# Altium schematic symbol library Regulator_Switching.SchLib: 1070 symbols (part 7 of 9) (continued)
## TNY286D (continued)
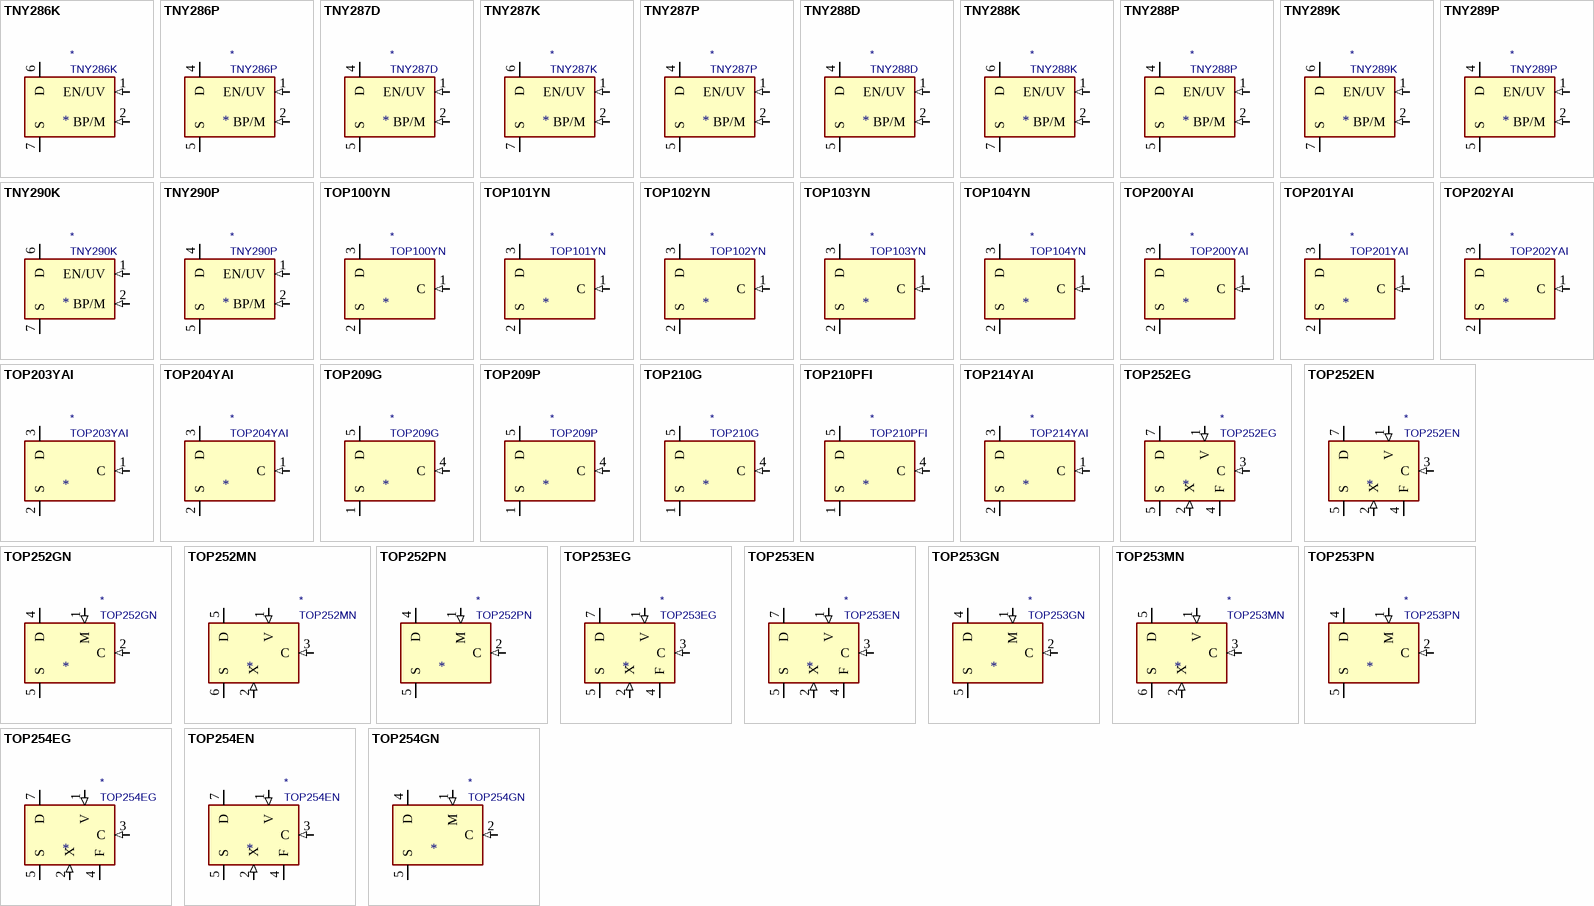
[diagram p21: symbols TNY286K to TOP254GN]

## TNY286K
designator *  value TNY286K
ki_keywords: Energy-Efficient, Off-Line Switcher With Line Compensated Overload Power; ki_description: TinySwitch-4 Family, 15W Output Power, eSOP-12B; ki_fp_filters: PowerIntegrations?eSOP?12B*; Footprint: Package_SO:PowerIntegrations_eSOP-12B; Supplier: https://ac-dc.power.com/sites/default/files/product-docs/tinyswitch-4_family_datasheet.pdf
footprint PowerIntegrations_eSOP-12B
pins: 1 EN/UV (in), 2 BP/M (in), 3 NC (in) hidden, 4 NC (in) hidden, 6 D (oc), 7 S (power), 8 S hidden, 9 S hidden, 10 S hidden, 11 S hidden, 12 S hidden, 13 S hidden

## TNY286P
designator *  value TNY286P
ki_keywords: Energy-Efficient, Off-Line Switcher With Line Compensated Overload Power; ki_description: TinySwitch-4 Family, 15W Output Power, PDIP-8C; ki_fp_filters: PowerIntegrations?PDIP?8C*; Footprint: Package_DIP:PowerIntegrations_PDIP-8C; Supplier: https://ac-dc.power.com/sites/default/files/product-docs/tinyswitch-4_family_datasheet.pdf
footprint PowerIntegrations_PDIP-8C
pins: 1 EN/UV (in), 2 BP/M (in), 4 D (oc), 5 S (power), 6 S hidden, 7 S hidden, 8 S hidden

## TNY287D
designator *  value TNY287D
ki_keywords: Energy-Efficient, Off-Line Switcher With Line Compensated Overload Power; ki_description: TinySwitch-4 Family, 18W Output Power, SO-8C; ki_fp_filters: PowerIntegrations?SO?8C*; Footprint: Package_SO:PowerIntegrations_SO-8C; Supplier: https://ac-dc.power.com/sites/default/files/product-docs/tinyswitch-4_family_datasheet.pdf
footprint PowerIntegrations_SO-8C
pins: 1 EN/UV (in), 2 BP/M (in), 4 D (oc), 5 S (power), 6 S hidden, 7 S hidden, 8 S hidden

## TNY287K
designator *  value TNY287K
ki_keywords: Energy-Efficient, Off-Line Switcher With Line Compensated Overload Power; ki_description: TinySwitch-4 Family, 18W Output Power, eSOP-12B; ki_fp_filters: PowerIntegrations?eSOP?12B*; Footprint: Package_SO:PowerIntegrations_eSOP-12B; Supplier: https://ac-dc.power.com/sites/default/files/product-docs/tinyswitch-4_family_datasheet.pdf
footprint PowerIntegrations_eSOP-12B
pins: 1 EN/UV (in), 2 BP/M (in), 3 NC (in) hidden, 4 NC (in) hidden, 6 D (oc), 7 S (power), 8 S hidden, 9 S hidden, 10 S hidden, 11 S hidden, 12 S hidden, 13 S hidden

## TNY287P
designator *  value TNY287P
ki_keywords: Energy-Efficient, Off-Line Switcher With Line Compensated Overload Power; ki_description: TinySwitch-4 Family, 18W Output Power, PDIP-8C; ki_fp_filters: PowerIntegrations?PDIP?8C*; Footprint: Package_DIP:PowerIntegrations_PDIP-8C; Supplier: https://ac-dc.power.com/sites/default/files/product-docs/tinyswitch-4_family_datasheet.pdf
footprint PowerIntegrations_PDIP-8C
pins: 1 EN/UV (in), 2 BP/M (in), 4 D (oc), 5 S (power), 6 S hidden, 7 S hidden, 8 S hidden

## TNY288D
designator *  value TNY288D
ki_keywords: Energy-Efficient, Off-Line Switcher With Line Compensated Overload Power; ki_description: TinySwitch-4 Family, 19.5W Output Power, SO-8C; ki_fp_filters: PowerIntegrations?SO?8C*; Footprint: Package_SO:PowerIntegrations_SO-8C; Supplier: https://ac-dc.power.com/sites/default/files/product-docs/tinyswitch-4_family_datasheet.pdf
footprint PowerIntegrations_SO-8C
pins: 1 EN/UV (in), 2 BP/M (in), 4 D (oc), 5 S (power), 6 S hidden, 7 S hidden, 8 S hidden

## TNY288K
designator *  value TNY288K
ki_keywords: Energy-Efficient, Off-Line Switcher With Line Compensated Overload Power; ki_description: TinySwitch-4 Family, 21.5W Output Power, eSOP-12B; ki_fp_filters: PowerIntegrations?eSOP?12B*; Footprint: Package_SO:PowerIntegrations_eSOP-12B; Supplier: https://ac-dc.power.com/sites/default/files/product-docs/tinyswitch-4_family_datasheet.pdf
footprint PowerIntegrations_eSOP-12B
pins: 1 EN/UV (in), 2 BP/M (in), 3 NC (in) hidden, 4 NC (in) hidden, 6 D (oc), 7 S (power), 8 S hidden, 9 S hidden, 10 S hidden, 11 S hidden, 12 S hidden, 13 S hidden

## TNY288P
designator *  value TNY288P
ki_keywords: Energy-Efficient, Off-Line Switcher With Line Compensated Overload Power; ki_description: TinySwitch-4 Family, 21.5W Output Power, PDIP-8C; ki_fp_filters: PowerIntegrations?PDIP?8C*; Footprint: Package_DIP:PowerIntegrations_PDIP-8C; Supplier: https://ac-dc.power.com/sites/default/files/product-docs/tinyswitch-4_family_datasheet.pdf
footprint PowerIntegrations_PDIP-8C
pins: 1 EN/UV (in), 2 BP/M (in), 4 D (oc), 5 S (power), 6 S hidden, 7 S hidden, 8 S hidden

## TNY289K
designator *  value TNY289K
ki_keywords: Energy-Efficient, Off-Line Switcher With Line Compensated Overload Power; ki_description: TinySwitch-4 Family, 25W Output Power, eSOP-12B; ki_fp_filters: PowerIntegrations?eSOP?12B*; Footprint: Package_SO:PowerIntegrations_eSOP-12B; Supplier: https://ac-dc.power.com/sites/default/files/product-docs/tinyswitch-4_family_datasheet.pdf
footprint PowerIntegrations_eSOP-12B
pins: 1 EN/UV (in), 2 BP/M (in), 3 NC (in) hidden, 4 NC (in) hidden, 6 D (oc), 7 S (power), 8 S hidden, 9 S hidden, 10 S hidden, 11 S hidden, 12 S hidden, 13 S hidden

## TNY289P
designator *  value TNY289P
ki_keywords: Energy-Efficient, Off-Line Switcher With Line Compensated Overload Power; ki_description: TinySwitch-4 Family, 25W Output Power, PDIP-8C; ki_fp_filters: PowerIntegrations?PDIP?8C*; Footprint: Package_DIP:PowerIntegrations_PDIP-8C; Supplier: https://ac-dc.power.com/sites/default/files/product-docs/tinyswitch-4_family_datasheet.pdf
footprint PowerIntegrations_PDIP-8C
pins: 1 EN/UV (in), 2 BP/M (in), 4 D (oc), 5 S (power), 6 S hidden, 7 S hidden, 8 S hidden

## TNY290K
designator *  value TNY290K
ki_keywords: Energy-Efficient, Off-Line Switcher With Line Compensated Overload Power; ki_description: TinySwitch-4 Family, 28.5W Output Power, eSOP-12B; ki_fp_filters: PowerIntegrations?eSOP?12B*; Footprint: Package_SO:PowerIntegrations_eSOP-12B; Supplier: https://ac-dc.power.com/sites/default/files/product-docs/tinyswitch-4_family_datasheet.pdf
footprint PowerIntegrations_eSOP-12B
pins: 1 EN/UV (in), 2 BP/M (in), 3 NC (in) hidden, 4 NC (in) hidden, 6 D (oc), 7 S (power), 8 S hidden, 9 S hidden, 10 S hidden, 11 S hidden, 12 S hidden, 13 S hidden

## TNY290P
designator *  value TNY290P
ki_keywords: Energy-Efficient, Off-Line Switcher With Line Compensated Overload Power; ki_description: TinySwitch-4 Family, 28.5W Output Power, PDIP-8C; ki_fp_filters: PowerIntegrations?PDIP?8C*; Footprint: Package_DIP:PowerIntegrations_PDIP-8C; Supplier: https://ac-dc.power.com/sites/default/files/product-docs/tinyswitch-4_family_datasheet.pdf
footprint PowerIntegrations_PDIP-8C
pins: 1 EN/UV (in), 2 BP/M (in), 4 D (oc), 5 S (power), 6 S hidden, 7 S hidden, 8 S hidden

## TOP100YN
designator *  value TOP100YN
ki_keywords: Three-terminal Off-line PWM Switch; ki_description: TOPSwitch Family, 20W Max Output Power, TO-220; ki_fp_filters: TO?220*; Footprint: Package_TO_SOT_THT:TO-220-3_Vertical; Supplier: http://www.powerint.com/sites/default/files/product-docs/top100.pdf
footprint TO-220-3_Vertical
pins: 1 C (in), 2 S (power), 3 D (oc)

## TOP101YN
designator *  value TOP101YN
ki_keywords: Three-terminal Off-line PWM Switch; ki_description: TOPSwitch Family, 35W Max Output Power, TO-220; ki_fp_filters: TO?220*; Footprint: Package_TO_SOT_THT:TO-220-3_Vertical; Supplier: http://www.powerint.com/sites/default/files/product-docs/top100.pdf
footprint TO-220-3_Vertical
pins: 1 C (in), 2 S (power), 3 D (oc)

## TOP102YN
designator *  value TOP102YN
ki_keywords: Three-terminal Off-line PWM Switch; ki_description: TOPSwitch Family, 45W Max Output Power, TO-220; ki_fp_filters: TO?220*; Footprint: Package_TO_SOT_THT:TO-220-3_Vertical; Supplier: http://www.powerint.com/sites/default/files/product-docs/top100.pdf
footprint TO-220-3_Vertical
pins: 1 C (in), 2 S (power), 3 D (oc)

## TOP103YN
designator *  value TOP103YN
ki_keywords: Three-terminal Off-line PWM Switch; ki_description: TOPSwitch Family, 55W Max Output Power, TO-220; ki_fp_filters: TO?220*; Footprint: Package_TO_SOT_THT:TO-220-3_Vertical; Supplier: http://www.powerint.com/sites/default/files/product-docs/top100.pdf
footprint TO-220-3_Vertical
pins: 1 C (in), 2 S (power), 3 D (oc)

## TOP104YN
designator *  value TOP104YN
ki_keywords: Three-terminal Off-line PWM Switch; ki_description: TOPSwitch Family, 60W Max Output Power, TO-220; ki_fp_filters: TO?220*; Footprint: Package_TO_SOT_THT:TO-220-3_Vertical; Supplier: http://www.powerint.com/sites/default/files/product-docs/top100.pdf
footprint TO-220-3_Vertical
pins: 1 C (in), 2 S (power), 3 D (oc)

## TOP200YAI
designator *  value TOP200YAI
ki_keywords: Three-terminal Off-line PWM Switch; ki_description: TOPSwitch Family, 12W Max Output Power, TO-220; ki_fp_filters: TO?220*; Footprint: Package_TO_SOT_THT:TO-220-3_Vertical; Supplier: http://www.powerint.com/sites/default/files/product-docs/top200-204214.pdf
footprint TO-220-3_Vertical
pins: 1 C (in), 2 S (power), 3 D (oc)

## TOP201YAI
designator *  value TOP201YAI
ki_keywords: Three-terminal Off-line PWM Switch; ki_description: TOPSwitch Family, 22W Max Output Power, TO-220; ki_fp_filters: TO?220*; Footprint: Package_TO_SOT_THT:TO-220-3_Vertical; Supplier: http://www.powerint.com/sites/default/files/product-docs/top200-204214.pdf
footprint TO-220-3_Vertical
pins: 1 C (in), 2 S (power), 3 D (oc)

## TOP202YAI
designator *  value TOP202YAI
ki_keywords: Three-terminal Off-line PWM Switch; ki_description: TOPSwitch Family, 30W Max Output Power, TO-220; ki_fp_filters: TO?220*; Footprint: Package_TO_SOT_THT:TO-220-3_Vertical; Supplier: http://www.powerint.com/sites/default/files/product-docs/top200-204214.pdf
footprint TO-220-3_Vertical
pins: 1 C (in), 2 S (power), 3 D (oc)

## TOP203YAI
designator *  value TOP203YAI
ki_keywords: Three-terminal Off-line PWM Switch; ki_description: TOPSwitch Family, 35W Max Output Power, TO-220; ki_fp_filters: TO?220*; Footprint: Package_TO_SOT_THT:TO-220-3_Vertical; Supplier: http://www.powerint.com/sites/default/files/product-docs/top200-204214.pdf
footprint TO-220-3_Vertical
pins: 1 C (in), 2 S (power), 3 D (oc)

## TOP204YAI
designator *  value TOP204YAI
ki_keywords: Three-terminal Off-line PWM Switch; ki_description: TOPSwitch Family, 50W Max Output Power, TO-220; ki_fp_filters: TO?220*; Footprint: Package_TO_SOT_THT:TO-220-3_Vertical; Supplier: http://www.powerint.com/sites/default/files/product-docs/top200-204214.pdf
footprint TO-220-3_Vertical
pins: 1 C (in), 2 S (power), 3 D (oc)

## TOP209G
designator *  value TOP209G
ki_keywords: Three-terminal Off-line PWM Switch; ki_description: TOPSwitch Family, 2W Max Output Power, SMD-8; ki_fp_filters: PowerIntegrations?SMD?8*; Footprint: Package_DIP:PowerIntegrations_SMD-8; Supplier: http://www.powerint.com/sites/default/files/product-docs/top209210.pdf
footprint PowerIntegrations_SMD-8
pins: 1 S (power), 2 NC (in) hidden, 3 NC (in) hidden, 4 C (in), 5 D (oc), 6 NC (in) hidden, 7 NC (in) hidden, 8 S hidden

## TOP209P
designator *  value TOP209P
ki_keywords: Three-terminal Off-line PWM Switch; ki_description: TOPSwitch Family, 2W Max Output Power, DIP-8; ki_fp_filters: DIP*W7.62mm*; Footprint: Package_DIP:DIP-8_W7.62mm; Supplier: http://www.powerint.com/sites/default/files/product-docs/top209210.pdf
footprint DIP-8_W7.62mm
pins: 1 S (power), 2 NC (in) hidden, 3 NC (in) hidden, 4 C (in), 5 D (oc), 6 NC (in) hidden, 7 NC (in) hidden, 8 S hidden

## TOP210G
designator *  value TOP210G
ki_keywords: Three-terminal Off-line PWM Switch; ki_description: TOPSwitch Family, 5W Max Output Power, SMD-8; ki_fp_filters: PowerIntegrations?SMD?8*; Footprint: Package_DIP:PowerIntegrations_SMD-8; Supplier: http://www.powerint.com/sites/default/files/product-docs/top209210.pdf
footprint PowerIntegrations_SMD-8
pins: 1 S (power), 2 NC (in) hidden, 3 NC (in) hidden, 4 C (in), 5 D (oc), 6 NC (in) hidden, 7 NC (in) hidden, 8 S hidden

## TOP210PFI
designator *  value TOP210PFI
ki_keywords: Three-terminal Off-line PWM Switch; ki_description: TOPSwitch Family, 5W Max Output Power, DIP-8; ki_fp_filters: DIP*W7.62mm*; Footprint: Package_DIP:DIP-8_W7.62mm; Supplier: http://www.powerint.com/sites/default/files/product-docs/top209210.pdf
footprint DIP-8_W7.62mm
pins: 1 S (power), 2 NC (in) hidden, 3 NC (in) hidden, 4 C (in), 5 D (oc), 6 NC (in) hidden, 7 NC (in) hidden, 8 S hidden

## TOP214YAI
designator *  value TOP214YAI
ki_keywords: Three-terminal Off-line PWM Switch; ki_description: TOPSwitch Family, 42W Max Output Power, TO-220; ki_fp_filters: TO?220*; Footprint: Package_TO_SOT_THT:TO-220-3_Vertical; Supplier: http://www.powerint.com/sites/default/files/product-docs/top200-204214.pdf
footprint TO-220-3_Vertical
pins: 1 C (in), 2 S (power), 3 D (oc)

## TOP252EG
designator *  value TOP252EG
ki_keywords: Eco Smart Off-Line Switcher, Extendend Power Range; ki_description: TOPSwitch-HX Family, 13W Output Power; ki_fp_filters: PowerIntegrations?eSIP?7C*; Footprint: Package_SIP:PowerIntegrations_eSIP-7C; Supplier: https://ac-dc.power.com/sites/default/files/product-docs/topswitch-hx_family_datasheet.pdf
footprint PowerIntegrations_eSIP-7C
pins: 1 V (in), 2 X (in), 3 C (in), 4 F, 5 S (power), 7 D (oc)

## TOP252EN
designator *  value TOP252EN
ki_keywords: Eco Smart Off-Line Switcher, Extendend Power Range; ki_description: TOPSwitch-HX Family, 13W Output Power; ki_fp_filters: PowerIntegrations?eSIP?7C*; Footprint: Package_SIP:PowerIntegrations_eSIP-7C; Supplier: https://ac-dc.power.com/sites/default/files/product-docs/topswitch-hx_family_datasheet.pdf
footprint PowerIntegrations_eSIP-7C
pins: 1 V (in), 2 X (in), 3 C (in), 4 F, 5 S (power), 7 D (oc)

## TOP252GN
designator *  value TOP252GN
ki_keywords: Eco Smart Off-Line Switcher, Extendend Power Range; ki_description: TOPSwitch-HX Family, 10W Output Power; ki_fp_filters: PowerIntegrations?SMD?8C*; Footprint: Package_DIP:PowerIntegrations_SMD-8C; Supplier: https://ac-dc.power.com/sites/default/files/product-docs/topswitch-hx_family_datasheet.pdf
footprint PowerIntegrations_SMD-8C
pins: 1 M (in), 2 C (in), 4 D (oc), 5 S (power), 6 S hidden, 7 S hidden, 8 S hidden

## TOP252MN
designator *  value TOP252MN
ki_keywords: Eco Smart Off-Line Switcher, Extendend Power Range; ki_description: TOPSwitch-HX Family, 10W Output Power; ki_fp_filters: PowerIntegrations?SDIP?10C*; Footprint: Package_DIP:PowerIntegrations_SDIP-10C; Supplier: https://ac-dc.power.com/sites/default/files/product-docs/topswitch-hx_family_datasheet.pdf
footprint PowerIntegrations_SDIP-10C
pins: 1 V (in), 2 X (in), 3 C (in), 5 D (oc), 6 S (power), 7 S hidden, 8 S hidden, 9 S hidden, 10 S hidden

## TOP252PN
designator *  value TOP252PN
ki_keywords: Eco Smart Off-Line Switcher, Extendend Power Range; ki_description: TOPSwitch-HX Family, 10W Output Power; ki_fp_filters: PowerIntegrations?PDIP?8C*; Footprint: Package_DIP:PowerIntegrations_PDIP-8C; Supplier: https://ac-dc.power.com/sites/default/files/product-docs/topswitch-hx_family_datasheet.pdf
footprint PowerIntegrations_PDIP-8C
pins: 1 M (in), 2 C (in), 4 D (oc), 5 S (power), 6 S hidden, 7 S hidden, 8 S hidden

## TOP253EG
designator *  value TOP253EG
ki_keywords: Eco Smart Off-Line Switcher, Extendend Power Range; ki_description: TOPSwitch-HX Family, 29W Output Power; ki_fp_filters: PowerIntegrations?eSIP?7C*; Footprint: Package_SIP:PowerIntegrations_eSIP-7C; Supplier: https://ac-dc.power.com/sites/default/files/product-docs/topswitch-hx_family_datasheet.pdf
footprint PowerIntegrations_eSIP-7C
pins: 1 V (in), 2 X (in), 3 C (in), 4 F, 5 S (power), 7 D (oc)

## TOP253EN
designator *  value TOP253EN
ki_keywords: Eco Smart Off-Line Switcher, Extendend Power Range; ki_description: TOPSwitch-HX Family, 29W Output Power; ki_fp_filters: PowerIntegrations?eSIP?7C*; Footprint: Package_SIP:PowerIntegrations_eSIP-7C; Supplier: https://ac-dc.power.com/sites/default/files/product-docs/topswitch-hx_family_datasheet.pdf
footprint PowerIntegrations_eSIP-7C
pins: 1 V (in), 2 X (in), 3 C (in), 4 F, 5 S (power), 7 D (oc)

## TOP253GN
designator *  value TOP253GN
ki_keywords: Eco Smart Off-Line Switcher, Extendend Power Range; ki_description: TOPSwitch-HX Family, 15W Output Power; ki_fp_filters: PowerIntegrations?SMD?8C*; Footprint: Package_DIP:PowerIntegrations_SMD-8C; Supplier: https://ac-dc.power.com/sites/default/files/product-docs/topswitch-hx_family_datasheet.pdf
footprint PowerIntegrations_SMD-8C
pins: 1 M (in), 2 C (in), 4 D (oc), 5 S (power), 6 S hidden, 7 S hidden, 8 S hidden

## TOP253MN
designator *  value TOP253MN
ki_keywords: Eco Smart Off-Line Switcher, Extendend Power Range; ki_description: TOPSwitch-HX Family, 15W Output Power; ki_fp_filters: PowerIntegrations?SDIP?10C*; Footprint: Package_DIP:PowerIntegrations_SDIP-10C; Supplier: https://ac-dc.power.com/sites/default/files/product-docs/topswitch-hx_family_datasheet.pdf
footprint PowerIntegrations_SDIP-10C
pins: 1 V (in), 2 X (in), 3 C (in), 5 D (oc), 6 S (power), 7 S hidden, 8 S hidden, 9 S hidden, 10 S hidden

## TOP253PN
designator *  value TOP253PN
ki_keywords: Eco Smart Off-Line Switcher, Extendend Power Range; ki_description: TOPSwitch-HX Family, 15W Output Power; ki_fp_filters: PowerIntegrations?PDIP?8C*; Footprint: Package_DIP:PowerIntegrations_PDIP-8C; Supplier: https://ac-dc.power.com/sites/default/files/product-docs/topswitch-hx_family_datasheet.pdf
footprint PowerIntegrations_PDIP-8C
pins: 1 M (in), 2 C (in), 4 D (oc), 5 S (power), 6 S hidden, 7 S hidden, 8 S hidden

## TOP254EG
designator *  value TOP254EG
ki_keywords: Eco Smart Off-Line Switcher, Extendend Power Range; ki_description: TOPSwitch-HX Family, 43W Output Power; ki_fp_filters: PowerIntegrations?eSIP?7C*; Footprint: Package_SIP:PowerIntegrations_eSIP-7C; Supplier: https://ac-dc.power.com/sites/default/files/product-docs/topswitch-hx_family_datasheet.pdf
footprint PowerIntegrations_eSIP-7C
pins: 1 V (in), 2 X (in), 3 C (in), 4 F, 5 S (power), 7 D (oc)

## TOP254EN
designator *  value TOP254EN
ki_keywords: Eco Smart Off-Line Switcher, Extendend Power Range; ki_description: TOPSwitch-HX Family, 43W Output Power; ki_fp_filters: PowerIntegrations?eSIP?7C*; Footprint: Package_SIP:PowerIntegrations_eSIP-7C; Supplier: https://ac-dc.power.com/sites/default/files/product-docs/topswitch-hx_family_datasheet.pdf
footprint PowerIntegrations_eSIP-7C
pins: 1 V (in), 2 X (in), 3 C (in), 4 F, 5 S (power), 7 D (oc)

## TOP254GN
designator *  value TOP254GN
ki_keywords: Eco Smart Off-Line Switcher, Extendend Power Range; ki_description: TOPSwitch-HX Family, 20W Output Power; ki_fp_filters: PowerIntegrations?SMD?8C*; Footprint: Package_DIP:PowerIntegrations_SMD-8C; Supplier: https://ac-dc.power.com/sites/default/files/product-docs/topswitch-hx_family_datasheet.pdf
footprint PowerIntegrations_SMD-8C
pins: 1 M (in), 2 C (in), 4 D (oc), 5 S (power), 6 S hidden, 7 S hidden, 8 S hidden

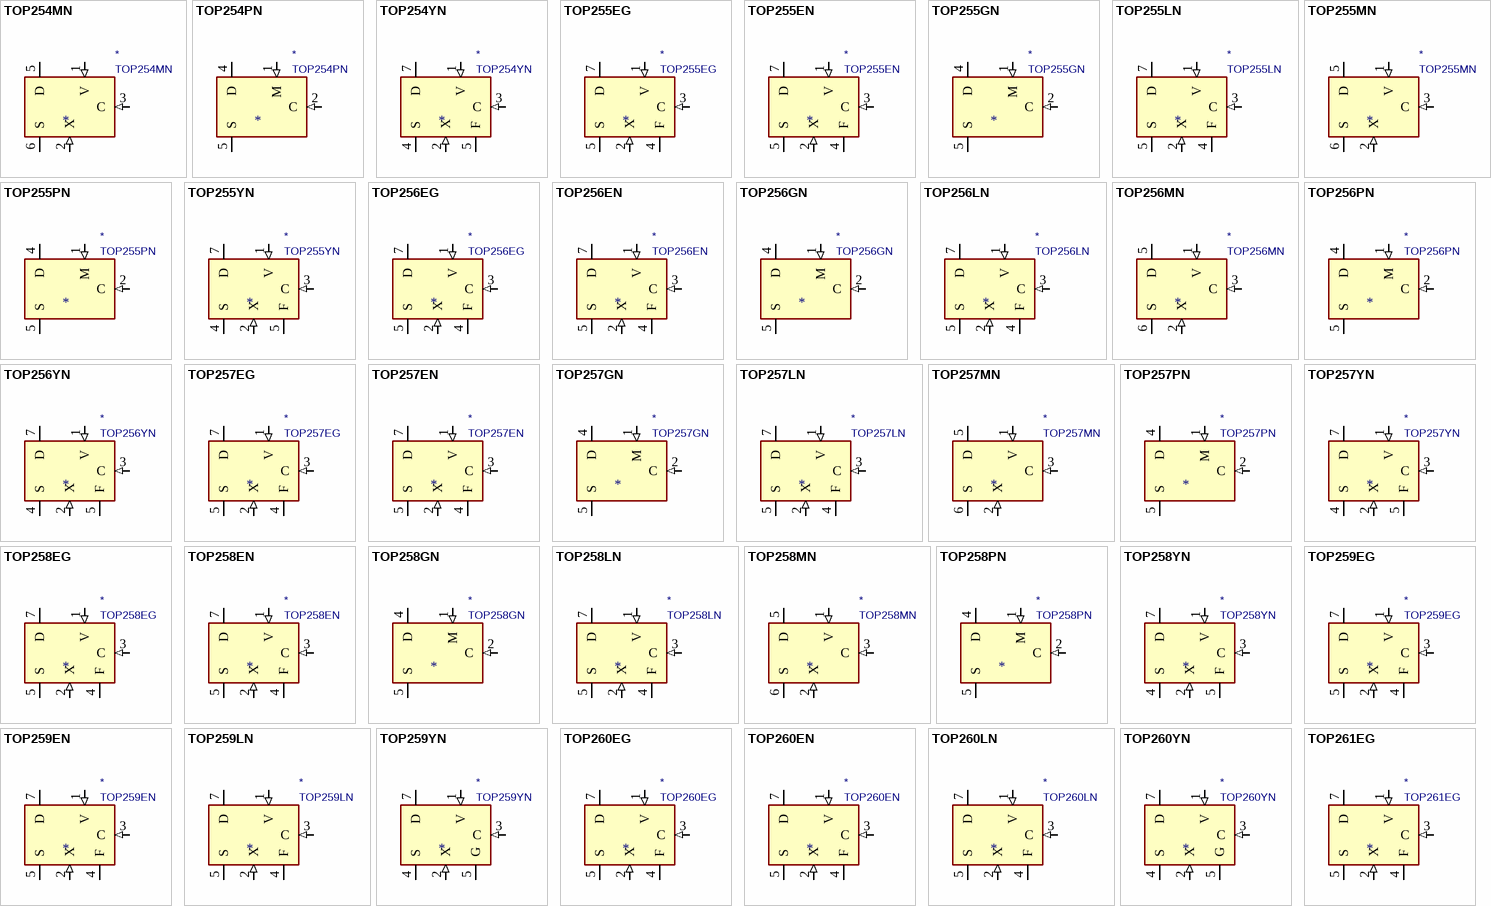
[diagram p22: symbols TOP254MN to TOP261EG]

## TOP254MN
designator *  value TOP254MN
ki_keywords: Eco Smart Off-Line Switcher, Extendend Power Range; ki_description: TOPSwitch-HX Family, 20W Output Power; ki_fp_filters: PowerIntegrations?SDIP?10C*; Footprint: Package_DIP:PowerIntegrations_SDIP-10C; Supplier: https://ac-dc.power.com/sites/default/files/product-docs/topswitch-hx_family_datasheet.pdf
footprint PowerIntegrations_SDIP-10C
pins: 1 V (in), 2 X (in), 3 C (in), 5 D (oc), 6 S (power), 7 S hidden, 8 S hidden, 9 S hidden, 10 S hidden

## TOP254PN
designator *  value TOP254PN
ki_keywords: Eco Smart Off-Line Switcher, Extendend Power Range; ki_description: TOPSwitch-HX Family, 20W Output Power; ki_fp_filters: PowerIntegrations?PDIP?8C*; Footprint: Package_DIP:PowerIntegrations_PDIP-8C; Supplier: https://ac-dc.power.com/sites/default/files/product-docs/topswitch-hx_family_datasheet.pdf
footprint PowerIntegrations_PDIP-8C
pins: 1 M (in), 2 C (in), 4 D (oc), 5 S (power), 6 S hidden, 7 S hidden, 8 S hidden

## TOP254YN
designator *  value TOP254YN
ki_keywords: Eco Smart Off-Line Switcher, Extendend Power Range; ki_description: TOPSwitch-HX Family, 43W Output Power; ki_fp_filters: PowerIntegrations*TO?220?7C*; Footprint: Package_TO_SOT_THT:PowerIntegrations_TO-220-7C; Supplier: https://ac-dc.power.com/sites/default/files/product-docs/topswitch-hx_family_datasheet.pdf
footprint PowerIntegrations_TO-220-7C
pins: 1 V (in), 2 X (in), 3 C (in), 4 S (power), 5 F, 7 D (oc)

## TOP255EG
designator *  value TOP255EG
ki_keywords: Eco Smart Off-Line Switcher, Extendend Power Range; ki_description: TOPSwitch-HX Family, 57W Output Power; ki_fp_filters: PowerIntegrations?eSIP?7C*; Footprint: Package_SIP:PowerIntegrations_eSIP-7C; Supplier: https://ac-dc.power.com/sites/default/files/product-docs/topswitch-hx_family_datasheet.pdf
footprint PowerIntegrations_eSIP-7C
pins: 1 V (in), 2 X (in), 3 C (in), 4 F, 5 S (power), 7 D (oc)

## TOP255EN
designator *  value TOP255EN
ki_keywords: Eco Smart Off-Line Switcher, Extendend Power Range; ki_description: TOPSwitch-HX Family, 57W Output Power; ki_fp_filters: PowerIntegrations?eSIP?7C*; Footprint: Package_SIP:PowerIntegrations_eSIP-7C; Supplier: https://ac-dc.power.com/sites/default/files/product-docs/topswitch-hx_family_datasheet.pdf
footprint PowerIntegrations_eSIP-7C
pins: 1 V (in), 2 X (in), 3 C (in), 4 F, 5 S (power), 7 D (oc)

## TOP255GN
designator *  value TOP255GN
ki_keywords: Eco Smart Off-Line Switcher, Extendend Power Range; ki_description: TOPSwitch-HX Family, 22W Output Power; ki_fp_filters: PowerIntegrations?SMD?8C*; Footprint: Package_DIP:PowerIntegrations_SMD-8C; Supplier: https://ac-dc.power.com/sites/default/files/product-docs/topswitch-hx_family_datasheet.pdf
footprint PowerIntegrations_SMD-8C
pins: 1 M (in), 2 C (in), 4 D (oc), 5 S (power), 6 S hidden, 7 S hidden, 8 S hidden

## TOP255LN
designator *  value TOP255LN
ki_keywords: Eco Smart Off-Line Switcher, Extendend Power Range; ki_description: TOPSwitch-HX Family, 57W Output Power; ki_fp_filters: PowerIntegrations?eSIP?7F*; Footprint: Package_SIP:PowerIntegrations_eSIP-7F; Supplier: https://ac-dc.power.com/sites/default/files/product-docs/topswitch-hx_family_datasheet.pdf
footprint PowerIntegrations_eSIP-7F
pins: 1 V (in), 2 X (in), 3 C (in), 4 F, 5 S (power), 7 D (oc)

## TOP255MN
designator *  value TOP255MN
ki_keywords: Eco Smart Off-Line Switcher, Extendend Power Range; ki_description: TOPSwitch-HX Family, 22W Output Power; ki_fp_filters: PowerIntegrations?SDIP?10C*; Footprint: Package_DIP:PowerIntegrations_SDIP-10C; Supplier: https://ac-dc.power.com/sites/default/files/product-docs/topswitch-hx_family_datasheet.pdf
footprint PowerIntegrations_SDIP-10C
pins: 1 V (in), 2 X (in), 3 C (in), 5 D (oc), 6 S (power), 7 S hidden, 8 S hidden, 9 S hidden, 10 S hidden

## TOP255PN
designator *  value TOP255PN
ki_keywords: Eco Smart Off-Line Switcher, Extendend Power Range; ki_description: TOPSwitch-HX Family, 22W Output Power; ki_fp_filters: PowerIntegrations?PDIP?8C*; Footprint: Package_DIP:PowerIntegrations_PDIP-8C; Supplier: https://ac-dc.power.com/sites/default/files/product-docs/topswitch-hx_family_datasheet.pdf
footprint PowerIntegrations_PDIP-8C
pins: 1 M (in), 2 C (in), 4 D (oc), 5 S (power), 6 S hidden, 7 S hidden, 8 S hidden

## TOP255YN
designator *  value TOP255YN
ki_keywords: Eco Smart Off-Line Switcher, Extendend Power Range; ki_description: TOPSwitch-HX Family, 57W Output Power; ki_fp_filters: PowerIntegrations*TO?220?7C*; Footprint: Package_TO_SOT_THT:PowerIntegrations_TO-220-7C; Supplier: https://ac-dc.power.com/sites/default/files/product-docs/topswitch-hx_family_datasheet.pdf
footprint PowerIntegrations_TO-220-7C
pins: 1 V (in), 2 X (in), 3 C (in), 4 S (power), 5 F, 7 D (oc)

## TOP256EG
designator *  value TOP256EG
ki_keywords: Eco Smart Off-Line Switcher, Extendend Power Range; ki_description: TOPSwitch-HX Family, 86W Output Power; ki_fp_filters: PowerIntegrations?eSIP?7C*; Footprint: Package_SIP:PowerIntegrations_eSIP-7C; Supplier: https://ac-dc.power.com/sites/default/files/product-docs/topswitch-hx_family_datasheet.pdf
footprint PowerIntegrations_eSIP-7C
pins: 1 V (in), 2 X (in), 3 C (in), 4 F, 5 S (power), 7 D (oc)

## TOP256EN
designator *  value TOP256EN
ki_keywords: Eco Smart Off-Line Switcher, Extendend Power Range; ki_description: TOPSwitch-HX Family, 86W Output Power; ki_fp_filters: PowerIntegrations?eSIP?7C*; Footprint: Package_SIP:PowerIntegrations_eSIP-7C; Supplier: https://ac-dc.power.com/sites/default/files/product-docs/topswitch-hx_family_datasheet.pdf
footprint PowerIntegrations_eSIP-7C
pins: 1 V (in), 2 X (in), 3 C (in), 4 F, 5 S (power), 7 D (oc)

## TOP256GN
designator *  value TOP256GN
ki_keywords: Eco Smart Off-Line Switcher, Extendend Power Range; ki_description: TOPSwitch-HX Family, 26W Output Power; ki_fp_filters: PowerIntegrations?SMD?8C*; Footprint: Package_DIP:PowerIntegrations_SMD-8C; Supplier: https://ac-dc.power.com/sites/default/files/product-docs/topswitch-hx_family_datasheet.pdf
footprint PowerIntegrations_SMD-8C
pins: 1 M (in), 2 C (in), 4 D (oc), 5 S (power), 6 S hidden, 7 S hidden, 8 S hidden

## TOP256LN
designator *  value TOP256LN
ki_keywords: Eco Smart Off-Line Switcher, Extendend Power Range; ki_description: TOPSwitch-HX Family, 64W Output Power; ki_fp_filters: PowerIntegrations?eSIP?7F*; Footprint: Package_SIP:PowerIntegrations_eSIP-7F; Supplier: https://ac-dc.power.com/sites/default/files/product-docs/topswitch-hx_family_datasheet.pdf
footprint PowerIntegrations_eSIP-7F
pins: 1 V (in), 2 X (in), 3 C (in), 4 F, 5 S (power), 7 D (oc)

## TOP256MN
designator *  value TOP256MN
ki_keywords: Eco Smart Off-Line Switcher, Extendend Power Range; ki_description: TOPSwitch-HX Family, 26W Output Power; ki_fp_filters: PowerIntegrations?SDIP?10C*; Footprint: Package_DIP:PowerIntegrations_SDIP-10C; Supplier: https://ac-dc.power.com/sites/default/files/product-docs/topswitch-hx_family_datasheet.pdf
footprint PowerIntegrations_SDIP-10C
pins: 1 V (in), 2 X (in), 3 C (in), 5 D (oc), 6 S (power), 7 S hidden, 8 S hidden, 9 S hidden, 10 S hidden

## TOP256PN
designator *  value TOP256PN
ki_keywords: Eco Smart Off-Line Switcher, Extendend Power Range; ki_description: TOPSwitch-HX Family, 26W Output Power; ki_fp_filters: PowerIntegrations?PDIP?8C*; Footprint: Package_DIP:PowerIntegrations_PDIP-8C; Supplier: https://ac-dc.power.com/sites/default/files/product-docs/topswitch-hx_family_datasheet.pdf
footprint PowerIntegrations_PDIP-8C
pins: 1 M (in), 2 C (in), 4 D (oc), 5 S (power), 6 S hidden, 7 S hidden, 8 S hidden

## TOP256YN
designator *  value TOP256YN
ki_keywords: Eco Smart Off-Line Switcher, Extendend Power Range; ki_description: TOPSwitch-HX Family, 86W Output Power; ki_fp_filters: PowerIntegrations*TO?220?7C*; Footprint: Package_TO_SOT_THT:PowerIntegrations_TO-220-7C; Supplier: https://ac-dc.power.com/sites/default/files/product-docs/topswitch-hx_family_datasheet.pdf
footprint PowerIntegrations_TO-220-7C
pins: 1 V (in), 2 X (in), 3 C (in), 4 S (power), 5 F, 7 D (oc)

## TOP257EG
designator *  value TOP257EG
ki_keywords: Eco Smart Off-Line Switcher, Extendend Power Range; ki_description: TOPSwitch-HX Family, 119W Output Power; ki_fp_filters: PowerIntegrations?eSIP?7C*; Footprint: Package_SIP:PowerIntegrations_eSIP-7C; Supplier: https://ac-dc.power.com/sites/default/files/product-docs/topswitch-hx_family_datasheet.pdf
footprint PowerIntegrations_eSIP-7C
pins: 1 V (in), 2 X (in), 3 C (in), 4 F, 5 S (power), 7 D (oc)

## TOP257EN
designator *  value TOP257EN
ki_keywords: Eco Smart Off-Line Switcher, Extendend Power Range; ki_description: TOPSwitch-HX Family, 119W Output Power; ki_fp_filters: PowerIntegrations?eSIP?7C*; Footprint: Package_SIP:PowerIntegrations_eSIP-7C; Supplier: https://ac-dc.power.com/sites/default/files/product-docs/topswitch-hx_family_datasheet.pdf
footprint PowerIntegrations_eSIP-7C
pins: 1 V (in), 2 X (in), 3 C (in), 4 F, 5 S (power), 7 D (oc)

## TOP257GN
designator *  value TOP257GN
ki_keywords: Eco Smart Off-Line Switcher, Extendend Power Range; ki_description: TOPSwitch-HX Family, 30W Output Power; ki_fp_filters: PowerIntegrations?SMD?8C*; Footprint: Package_DIP:PowerIntegrations_SMD-8C; Supplier: https://ac-dc.power.com/sites/default/files/product-docs/topswitch-hx_family_datasheet.pdf
footprint PowerIntegrations_SMD-8C
pins: 1 M (in), 2 C (in), 4 D (oc), 5 S (power), 6 S hidden, 7 S hidden, 8 S hidden

## TOP257LN
designator *  value TOP257LN
ki_keywords: Eco Smart Off-Line Switcher, Extendend Power Range; ki_description: TOPSwitch-HX Family, 78W Output Power; ki_fp_filters: PowerIntegrations?eSIP?7F*; Footprint: Package_SIP:PowerIntegrations_eSIP-7F; Supplier: https://ac-dc.power.com/sites/default/files/product-docs/topswitch-hx_family_datasheet.pdf
footprint PowerIntegrations_eSIP-7F
pins: 1 V (in), 2 X (in), 3 C (in), 4 F, 5 S (power), 7 D (oc)

## TOP257MN
designator *  value TOP257MN
ki_keywords: Eco Smart Off-Line Switcher, Extendend Power Range; ki_description: TOPSwitch-HX Family, 30W Output Power; ki_fp_filters: PowerIntegrations?SDIP?10C*; Footprint: Package_DIP:PowerIntegrations_SDIP-10C; Supplier: https://ac-dc.power.com/sites/default/files/product-docs/topswitch-hx_family_datasheet.pdf
footprint PowerIntegrations_SDIP-10C
pins: 1 V (in), 2 X (in), 3 C (in), 5 D (oc), 6 S (power), 7 S hidden, 8 S hidden, 9 S hidden, 10 S hidden

## TOP257PN
designator *  value TOP257PN
ki_keywords: Eco Smart Off-Line Switcher, Extendend Power Range; ki_description: TOPSwitch-HX Family, 30W Output Power; ki_fp_filters: PowerIntegrations?PDIP?8C*; Footprint: Package_DIP:PowerIntegrations_PDIP-8C; Supplier: https://ac-dc.power.com/sites/default/files/product-docs/topswitch-hx_family_datasheet.pdf
footprint PowerIntegrations_PDIP-8C
pins: 1 M (in), 2 C (in), 4 D (oc), 5 S (power), 6 S hidden, 7 S hidden, 8 S hidden

## TOP257YN
designator *  value TOP257YN
ki_keywords: Eco Smart Off-Line Switcher, Extendend Power Range; ki_description: TOPSwitch-HX Family, 119W Output Power; ki_fp_filters: PowerIntegrations*TO?220?7C*; Footprint: Package_TO_SOT_THT:PowerIntegrations_TO-220-7C; Supplier: https://ac-dc.power.com/sites/default/files/product-docs/topswitch-hx_family_datasheet.pdf
footprint PowerIntegrations_TO-220-7C
pins: 1 V (in), 2 X (in), 3 C (in), 4 S (power), 5 F, 7 D (oc)

## TOP258EG
designator *  value TOP258EG
ki_keywords: Eco Smart Off-Line Switcher, Extendend Power Range; ki_description: TOPSwitch-HX Family, 148W Output Power; ki_fp_filters: PowerIntegrations?eSIP?7C*; Footprint: Package_SIP:PowerIntegrations_eSIP-7C; Supplier: https://ac-dc.power.com/sites/default/files/product-docs/topswitch-hx_family_datasheet.pdf
footprint PowerIntegrations_eSIP-7C
pins: 1 V (in), 2 X (in), 3 C (in), 4 F, 5 S (power), 7 D (oc)

## TOP258EN
designator *  value TOP258EN
ki_keywords: Eco Smart Off-Line Switcher, Extendend Power Range; ki_description: TOPSwitch-HX Family, 148W Output Power; ki_fp_filters: PowerIntegrations?eSIP?7C*; Footprint: Package_SIP:PowerIntegrations_eSIP-7C; Supplier: https://ac-dc.power.com/sites/default/files/product-docs/topswitch-hx_family_datasheet.pdf
footprint PowerIntegrations_eSIP-7C
pins: 1 V (in), 2 X (in), 3 C (in), 4 F, 5 S (power), 7 D (oc)

## TOP258GN
designator *  value TOP258GN
ki_keywords: Eco Smart Off-Line Switcher, Extendend Power Range; ki_description: TOPSwitch-HX Family, 35W Output Power; ki_fp_filters: PowerIntegrations?SMD?8C*; Footprint: Package_DIP:PowerIntegrations_SMD-8C; Supplier: https://ac-dc.power.com/sites/default/files/product-docs/topswitch-hx_family_datasheet.pdf
footprint PowerIntegrations_SMD-8C
pins: 1 M (in), 2 C (in), 4 D (oc), 5 S (power), 6 S hidden, 7 S hidden, 8 S hidden

## TOP258LN
designator *  value TOP258LN
ki_keywords: Eco Smart Off-Line Switcher, Extendend Power Range; ki_description: TOPSwitch-HX Family, 92W Output Power; ki_fp_filters: PowerIntegrations?eSIP?7F*; Footprint: Package_SIP:PowerIntegrations_eSIP-7F; Supplier: https://ac-dc.power.com/sites/default/files/product-docs/topswitch-hx_family_datasheet.pdf
footprint PowerIntegrations_eSIP-7F
pins: 1 V (in), 2 X (in), 3 C (in), 4 F, 5 S (power), 7 D (oc)

## TOP258MN
designator *  value TOP258MN
ki_keywords: Eco Smart Off-Line Switcher, Extendend Power Range; ki_description: TOPSwitch-HX Family, 35W Output Power; ki_fp_filters: PowerIntegrations?SDIP?10C*; Footprint: Package_DIP:PowerIntegrations_SDIP-10C; Supplier: https://ac-dc.power.com/sites/default/files/product-docs/topswitch-hx_family_datasheet.pdf
footprint PowerIntegrations_SDIP-10C
pins: 1 V (in), 2 X (in), 3 C (in), 5 D (oc), 6 S (power), 7 S hidden, 8 S hidden, 9 S hidden, 10 S hidden

## TOP258PN
designator *  value TOP258PN
ki_keywords: Eco Smart Off-Line Switcher, Extendend Power Range; ki_description: TOPSwitch-HX Family, 35W Output Power; ki_fp_filters: PowerIntegrations?PDIP?8C*; Footprint: Package_DIP:PowerIntegrations_PDIP-8C; Supplier: https://ac-dc.power.com/sites/default/files/product-docs/topswitch-hx_family_datasheet.pdf
footprint PowerIntegrations_PDIP-8C
pins: 1 M (in), 2 C (in), 4 D (oc), 5 S (power), 6 S hidden, 7 S hidden, 8 S hidden

## TOP258YN
designator *  value TOP258YN
ki_keywords: Eco Smart Off-Line Switcher, Extendend Power Range; ki_description: TOPSwitch-HX Family, 148W Output Power; ki_fp_filters: PowerIntegrations*TO?220?7C*; Footprint: Package_TO_SOT_THT:PowerIntegrations_TO-220-7C; Supplier: https://ac-dc.power.com/sites/default/files/product-docs/topswitch-hx_family_datasheet.pdf
footprint PowerIntegrations_TO-220-7C
pins: 1 V (in), 2 X (in), 3 C (in), 4 S (power), 5 F, 7 D (oc)

## TOP259EG
designator *  value TOP259EG
ki_keywords: Eco Smart Off-Line Switcher, Extendend Power Range; ki_description: TOPSwitch-HX Family, 171W Output Power; ki_fp_filters: PowerIntegrations?eSIP?7C*; Footprint: Package_SIP:PowerIntegrations_eSIP-7C; Supplier: https://ac-dc.power.com/sites/default/files/product-docs/topswitch-hx_family_datasheet.pdf
footprint PowerIntegrations_eSIP-7C
pins: 1 V (in), 2 X (in), 3 C (in), 4 F, 5 S (power), 7 D (oc)

## TOP259EN
designator *  value TOP259EN
ki_keywords: Eco Smart Off-Line Switcher, Extendend Power Range; ki_description: TOPSwitch-HX Family, 171W Output Power; ki_fp_filters: PowerIntegrations?eSIP?7C*; Footprint: Package_SIP:PowerIntegrations_eSIP-7C; Supplier: https://ac-dc.power.com/sites/default/files/product-docs/topswitch-hx_family_datasheet.pdf
footprint PowerIntegrations_eSIP-7C
pins: 1 V (in), 2 X (in), 3 C (in), 4 F, 5 S (power), 7 D (oc)

## TOP259LN
designator *  value TOP259LN
ki_keywords: Eco Smart Off-Line Switcher, Extendend Power Range; ki_description: TOPSwitch-HX Family, 120W Output Power; ki_fp_filters: PowerIntegrations?eSIP?7F*; Footprint: Package_SIP:PowerIntegrations_eSIP-7F; Supplier: https://ac-dc.power.com/sites/default/files/product-docs/topswitch-hx_family_datasheet.pdf
footprint PowerIntegrations_eSIP-7F
pins: 1 V (in), 2 X (in), 3 C (in), 4 F, 5 S (power), 7 D (oc)

## TOP259YN
designator *  value TOP259YN
ki_keywords: Eco Smart Off-Line Switcher, Extendend Power Range; ki_description: TOPSwitch-HX Family, 171W Output Power; ki_fp_filters: PowerIntegrations*TO?220?7C*; Footprint: Package_TO_SOT_THT:PowerIntegrations_TO-220-7C; Supplier: https://ac-dc.power.com/sites/default/files/product-docs/topswitch-hx_family_datasheet.pdf
footprint PowerIntegrations_TO-220-7C
pins: 1 V (in), 2 X (in), 3 C (in), 4 S (power), 5 G, 7 D (oc)

## TOP260EG
designator *  value TOP260EG
ki_keywords: Eco Smart Off-Line Switcher, Extendend Power Range; ki_description: TOPSwitch-HX Family, 200W Output Power; ki_fp_filters: PowerIntegrations?eSIP?7C*; Footprint: Package_SIP:PowerIntegrations_eSIP-7C; Supplier: https://ac-dc.power.com/sites/default/files/product-docs/topswitch-hx_family_datasheet.pdf
footprint PowerIntegrations_eSIP-7C
pins: 1 V (in), 2 X (in), 3 C (in), 4 F, 5 S (power), 7 D (oc)

## TOP260EN
designator *  value TOP260EN
ki_keywords: Eco Smart Off-Line Switcher, Extendend Power Range; ki_description: TOPSwitch-HX Family, 200W Output Power; ki_fp_filters: PowerIntegrations?eSIP?7C*; Footprint: Package_SIP:PowerIntegrations_eSIP-7C; Supplier: https://ac-dc.power.com/sites/default/files/product-docs/topswitch-hx_family_datasheet.pdf
footprint PowerIntegrations_eSIP-7C
pins: 1 V (in), 2 X (in), 3 C (in), 4 F, 5 S (power), 7 D (oc)

## TOP260LN
designator *  value TOP260LN
ki_keywords: Eco Smart Off-Line Switcher, Extendend Power Range; ki_description: TOPSwitch-HX Family, 140W Output Power; ki_fp_filters: PowerIntegrations?eSIP?7F*; Footprint: Package_SIP:PowerIntegrations_eSIP-7F; Supplier: https://ac-dc.power.com/sites/default/files/product-docs/topswitch-hx_family_datasheet.pdf
footprint PowerIntegrations_eSIP-7F
pins: 1 V (in), 2 X (in), 3 C (in), 4 F, 5 S (power), 7 D (oc)

## TOP260YN
designator *  value TOP260YN
ki_keywords: Eco Smart Off-Line Switcher, Extendend Power Range; ki_description: TOPSwitch-HX Family, 200W Output Power; ki_fp_filters: PowerIntegrations*TO?220?7C*; Footprint: Package_TO_SOT_THT:PowerIntegrations_TO-220-7C; Supplier: https://ac-dc.power.com/sites/default/files/product-docs/topswitch-hx_family_datasheet.pdf
footprint PowerIntegrations_TO-220-7C
pins: 1 V (in), 2 X (in), 3 C (in), 4 S (power), 5 G, 7 D (oc)

## TOP261EG
designator *  value TOP261EG
ki_keywords: Eco Smart Off-Line Switcher, Extendend Power Range; ki_description: TOPSwitch-HX Family, 254W Output Power; ki_fp_filters: PowerIntegrations?eSIP?7C*; Footprint: Package_SIP:PowerIntegrations_eSIP-7C; Supplier: https://ac-dc.power.com/sites/default/files/product-docs/topswitch-hx_family_datasheet.pdf
footprint PowerIntegrations_eSIP-7C
pins: 1 V (in), 2 X (in), 3 C (in), 4 F, 5 S (power), 7 D (oc)

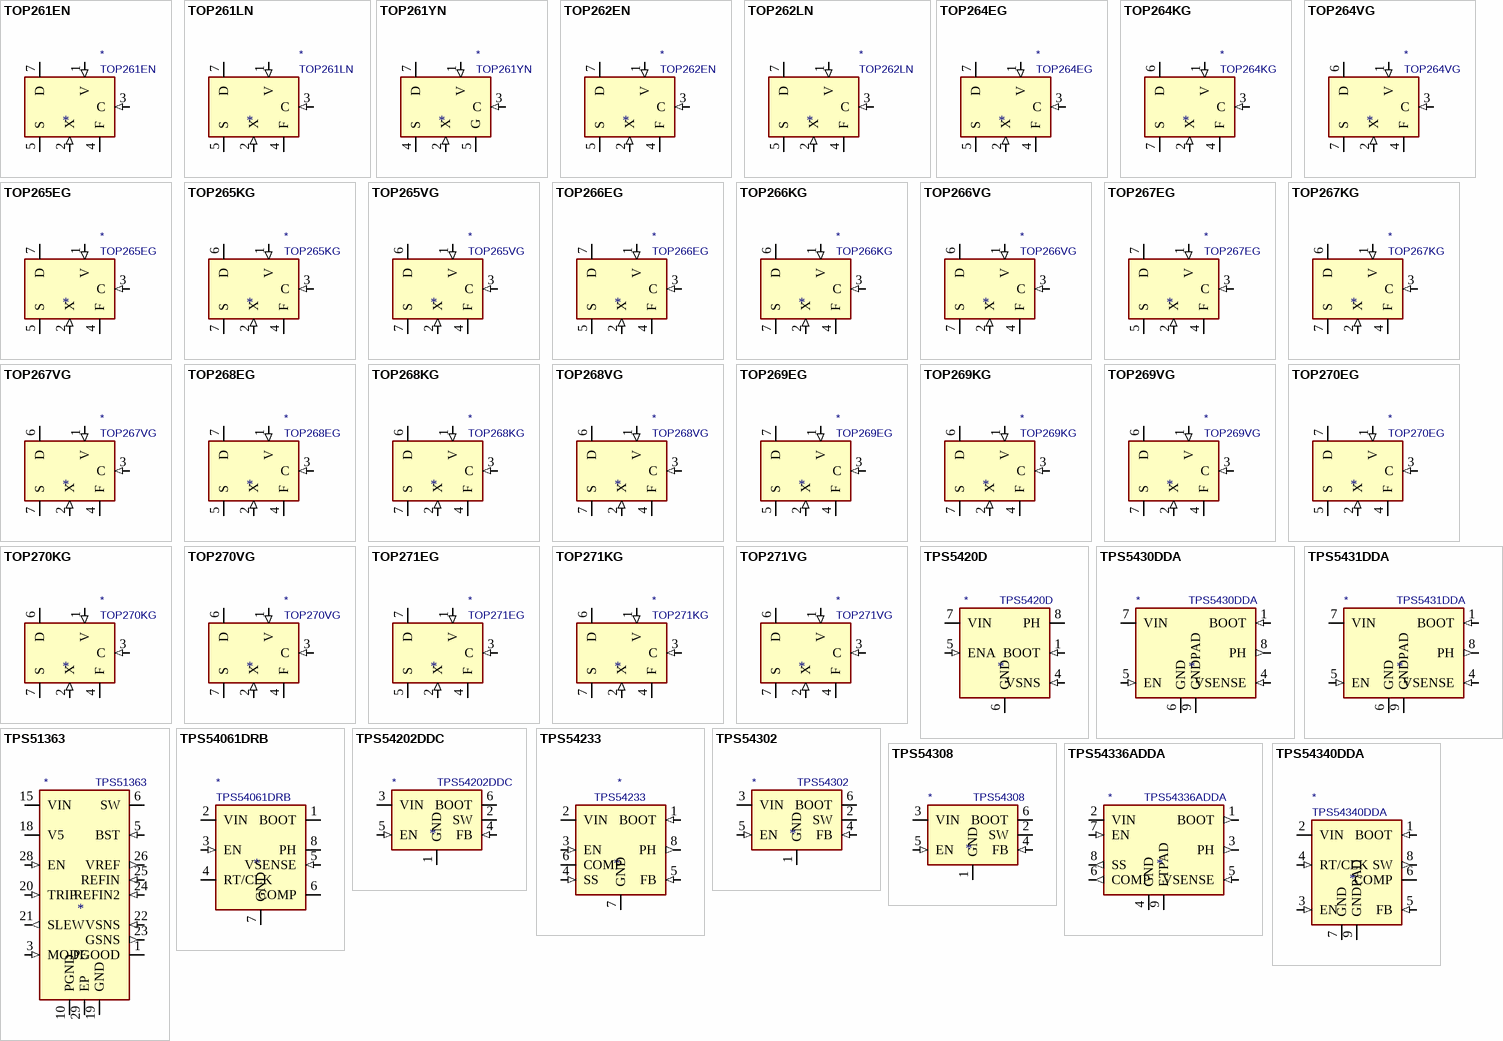
[diagram p23: symbols TOP261EN to TPS54340DDA]

## TOP261EN
designator *  value TOP261EN
ki_keywords: Eco Smart Off-Line Switcher, Extendend Power Range; ki_description: TOPSwitch-HX Family, 254W Output Power; ki_fp_filters: PowerIntegrations?eSIP?7C*; Footprint: Package_SIP:PowerIntegrations_eSIP-7C; Supplier: https://ac-dc.power.com/sites/default/files/product-docs/topswitch-hx_family_datasheet.pdf
footprint PowerIntegrations_eSIP-7C
pins: 1 V (in), 2 X (in), 3 C (in), 4 F, 5 S (power), 7 D (oc)

## TOP261LN
designator *  value TOP261LN
ki_keywords: Eco Smart Off-Line Switcher, Extendend Power Range; ki_description: TOPSwitch-HX Family, 177W Output Power; ki_fp_filters: PowerIntegrations?eSIP?7F*; Footprint: Package_SIP:PowerIntegrations_eSIP-7F; Supplier: https://ac-dc.power.com/sites/default/files/product-docs/topswitch-hx_family_datasheet.pdf
footprint PowerIntegrations_eSIP-7F
pins: 1 V (in), 2 X (in), 3 C (in), 4 F, 5 S (power), 7 D (oc)

## TOP261YN
designator *  value TOP261YN
ki_keywords: Eco Smart Off-Line Switcher, Extendend Power Range; ki_description: TOPSwitch-HX Family, 254W Output Power; ki_fp_filters: PowerIntegrations*TO?220?7C*; Footprint: Package_TO_SOT_THT:PowerIntegrations_TO-220-7C; Supplier: https://ac-dc.power.com/sites/default/files/product-docs/topswitch-hx_family_datasheet.pdf
footprint PowerIntegrations_TO-220-7C
pins: 1 V (in), 2 X (in), 3 C (in), 4 S (power), 5 G, 7 D (oc)